# Altium footprint library MEBot.PcbLib: 161 footprints (part 2 of 11)
Each footprint in its own frame and in the unit in brackets; x right, y up, seen from the top. Pads: shape width x height; smd on the part's side, far side on the other; paste and mask are expansions set on the pad; w line width, h text height; cw(c..) or ccw(c..) is an arc to the next point about the centre after c.
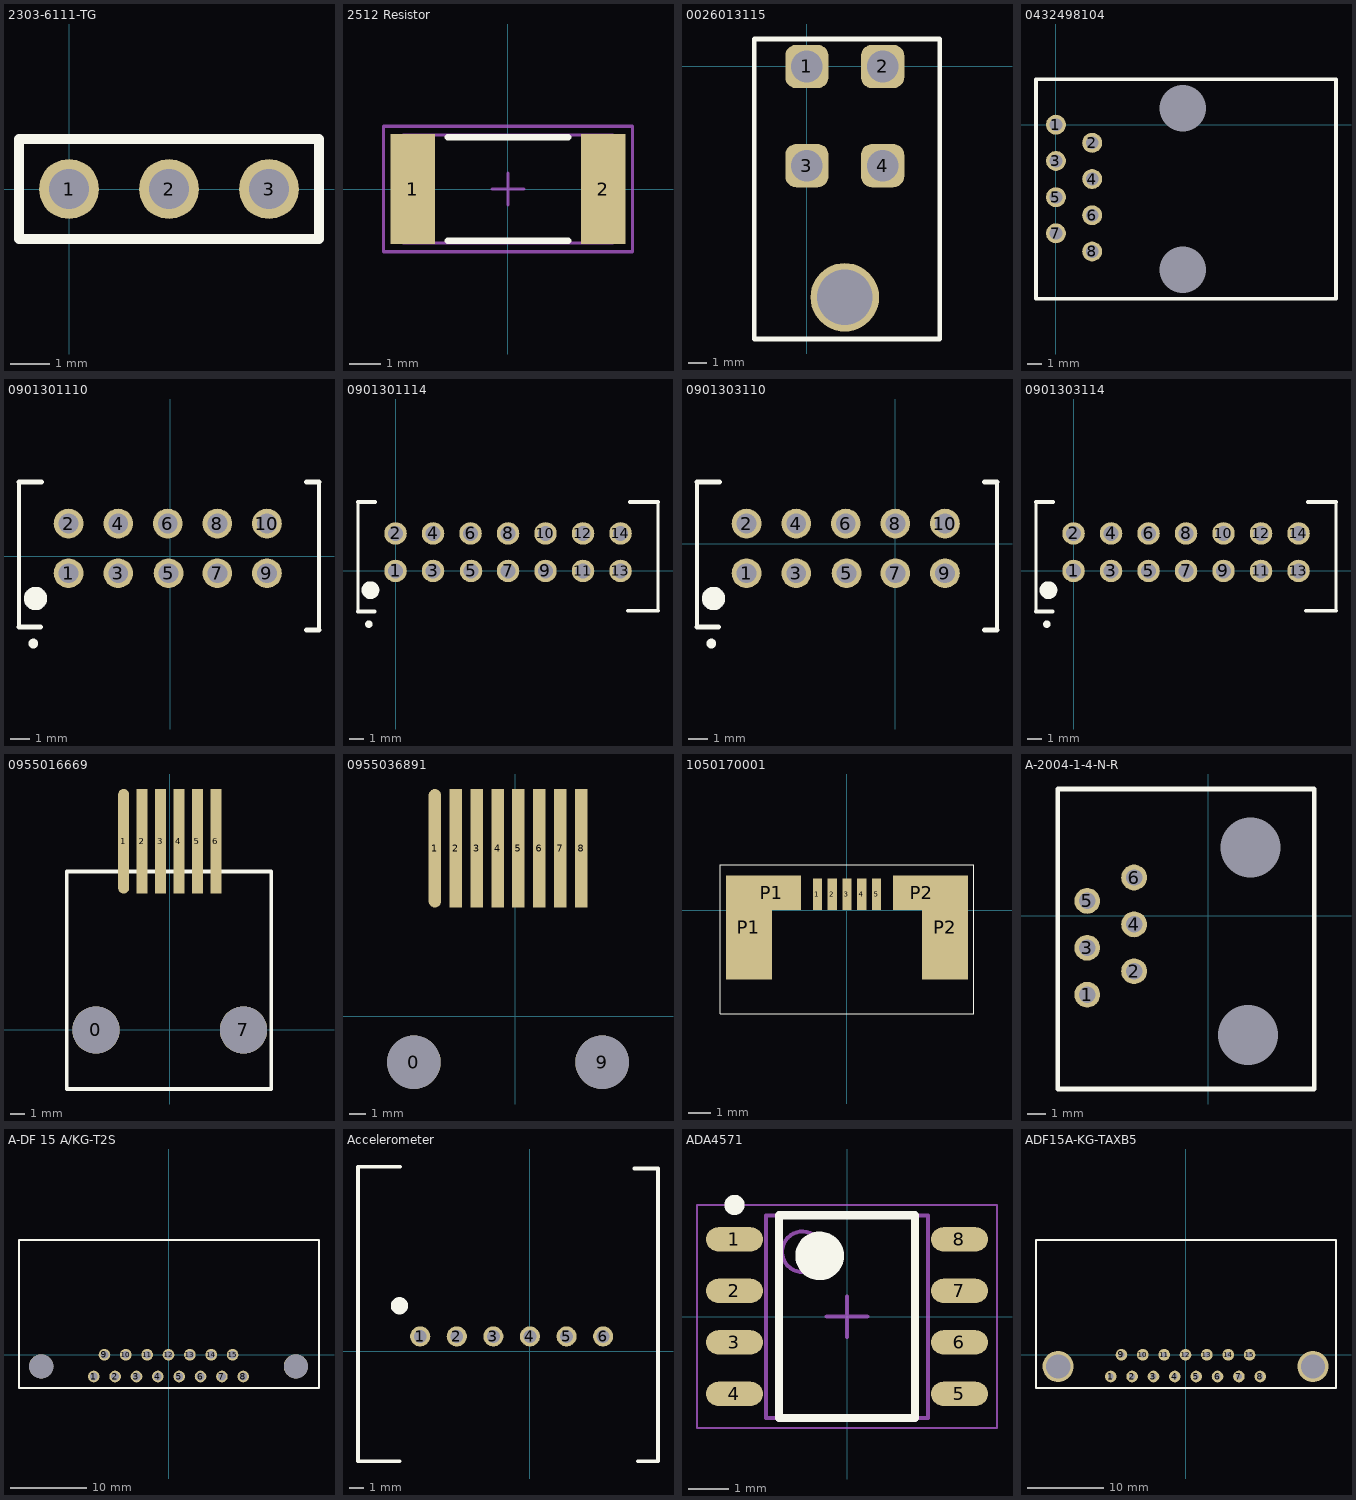
[diagram p1: the footprints below, top view; thin cyan lines are the x and y axes]

## 2303-6111-TG [mil] "CONN HEADER VERT 3POS 2.54MM"
pads (3):
  round 60 hole 40: 1(0,0) 2(100,0) 3(200,0)
Top Overlay:
  lines w10: -50,-50 250,-50 250,50 -50,50 -50,-50
3D body "Pin Header 3 x1 TH 2.54mm Pitch.stp": height 350, standoff -100, extent -50,-50 250,50
3D body "Pin Header 3 x1 TH 2.54mm Pitch.stp": height 350, standoff -100, extent -45,-40 255,60

## 2512 Resistor [mm] "Chip Resistor, 2-Leads, Body 6.4x3.2mm, IPC Medium Density"
height 0.7
pads (2):
  rect 1.4x3.45 smd: 1(-3,0) 2(3,0)
Top Overlay:
  lines w0.2: -1.9,-1.625 1.9,-1.625 ; -1.9,1.625 1.9,1.625
Mechanical 13:
  lines w0.1: -3.3,-1.7 3.3,-1.7 3.3,1.7 -3.3,1.7 -3.3,-1.7
Mechanical 15:
  lines w0.1: -0.5,0 0.5,0 ; 0,-0.5 0,0.5 ; -3.925,-1.975 3.925,-1.975 3.925,1.975 -3.925,1.975 -3.925,-1.975
3D body: height 0.7, standoff 0, extent -3.3,-1.7 3.3,1.7

## 0026013115 [mm] "CONN HEADER R/A 4POS 4.2MM"
pads (5):
  rrect50% 2.4x2.4 hole 1.75: 1(0,0) 2(4.2,0) 3(0,-5.5) 4(4.2,-5.5)
  round 3.8 hole 3.1: ""(2.1,-12.8)
Top Overlay:
  lines w0.254: -2.921,-15.113 -2.921,1.524 7.366,1.524 7.366,-15.113 -2.921,-15.113
3D body "026013115.stp": height 11.4, standoff -3.6, extent -2.667,-19.365 7.333,0.569

## 0432498104 [mil] "CONN MOD JACK 8P8C R/A UNSHLD"
pads (10):
  round 55 hole 35: 1(0,0) 2(100,-50) 3(0,-100) 4(100,-150) 5(0,-200) 6(100,-250) 7(0,-300) 8(100,-350)
  round 120 hole 127.95 unplated: ""(350.39,-400) ""(350.39,45)
Top Overlay:
  lines w10: -55,-480 -55,125 773.26,125 773.26,-480 -55,-480
3D body "432498104.stp": height 502.5, standoff -142.5, extent -46.74,-476.2 763.26,123.8

## 0901301110 [mil]
pads (10):
  round 60 hole 40: 1(-205,-33.86) 2(-205,66.14) 3(-105,-33.86) 4(-105,66.14) 5(-3.43,-33.86) 6(-5,66.14) 7(95,-33.86) 8(95,66.14) 9(195,-33.86) 10(195,66.14)
Top Overlay:
  circle w23.62: c-271.81,-85 r11.81
  circle w9.84: c-276.06,-175.79 r4.92
  lines w7.87: -305,-142.32 -305,150 ; 300,-148.23 300,150
  lines w10: -305,-142.32 -261.3,-142.32 ; -305,150 -259.53,150 ; 275,-148.23 300,-148.23 ; 275,150 300,150
3D body "901301110.stp": height 214.57, standoff -328.74, extent -301.06,-171.92 291.07,211.94

## 0901301114 [mil] "CONN HEADER VERT 14POS 2.54MM"
height 393.7
pads (14):
  round 60 hole 40: 1(0,0) 2(0,100) 3(100,0) 4(100,100) 5(201.57,0) 6(200,100) 7(300,0) 8(300,100) 9(400,0) 10(400,100) 11(500,0) 12(500,100) 13(600,0) 14(600,100)
Top Overlay:
  circle w23.62: c-66.81,-51.14 r11.81
  circle w9.84: c-71.06,-141.93 r4.92
  lines w7.87: -100,-108.46 -100,183.86 ; 700,-106.14 700,183.86
  lines w10: -100,-108.46 -56.3,-108.46 ; -100,183.86 -54.53,183.86 ; 620,-106.14 700,-106.14 ; 625,183.86 700,183.86
3D body "901301114.stp": height 434.57, standoff -108.74, extent -96.06,-140 696.06,243.86

## 0901303110 [mil] "CONN HEADER R/A 10POS 2.54MM"
height 393.7
pads (10):
  round 60 hole 40: 1(-300,-58.86) 2(-300,41.14) 3(-200,-58.86) 4(-200,41.14) 5(-98.43,-58.86) 6(-100,41.14) 7(0,-58.86) 8(0,41.14) 9(100,-58.86) 10(100,41.14)
Top Overlay:
  circle w9.84: c-371.06,-200.79 r4.92
  circle w23.62: c-366.81,-110 r11.81
  lines w7.87: -400,-167.32 -400,125 ; 205,-173.23 205,125
  lines w10: -400,-167.32 -356.3,-167.32 ; -400,125 -354.53,125 ; 180,-173.23 205,-173.23 ; 180,125 205,125
3D body "901303110.stp": height 391.93, standoff -106.1, extent -396.06,-472.68 196.07,55

## 0901303114 [mil] "CONN HEADER R/A 14POS 2.54MM"
height 393.7
pads (14):
  round 60 hole 40: 1(0,0) 2(0,100) 3(100,0) 4(100,100) 5(200,0) 6(200,100) 7(300,0) 8(300,100) 9(400,0) 10(400,100) 11(500,0) 12(500,100) 13(600,0) 14(600,100)
Top Overlay:
  circle w23.62: c-66.81,-51.14 r11.81
  circle w9.84: c-71.06,-141.93 r4.92
  lines w7.87: -100,-108.46 -100,183.86 ; 700,-106.14 700,183.86
  lines w10: -100,-108.46 -56.3,-108.46 ; -100,183.86 -54.53,183.86 ; 620,-106.14 700,-106.14 ; 625,183.86 700,183.86
3D body "901303114.stp": height 391.93, standoff -106.1, extent -96.06,-414.56 696.07,113.12

## 0955016669 [mm] "CONN MOD JACK 6P6C R/A UNSHLD"
height 16
pads (8):
  round 3.25 hole 3.25: 0(-5.08,0) 7(5.08,0)
  rrect100% 0.76x7.2 smd: 1(-3.175,13)
  rect 0.76x7.2 smd: 2(-1.905,13) 3(-0.635,13) 4(0.635,13) 5(1.905,13) 6(3.175,13)
Top Overlay:
  lines w0.254: -7.087,-4.064 -7.087,10.922 6.985,10.922 6.985,-4.064 -7.087,-4.064
3D body "955016669.stp": height 12.1, standoff -2.4, extent -6.68,-7.938 6.53,12.612

## 0955036891 [mm] "CONN MOD JACK 8P8C VERT UNSHLD"
pads (10):
  round 3.25 hole 3.25: 0(-6.144,-2.79) 9(5.286,-2.79)
  rrect100% 0.76x7.2 smd: 1(-4.874,10.21)
  rect 0.76x7.2 smd: 2(-3.604,10.21) 3(-2.334,10.21) 4(-1.064,10.21) 5(0.206,10.21) 6(1.476,10.21) 7(2.746,10.21) 8(4.016,10.21)
3D body "955036891.stp": height 15.72, standoff -2.98, extent -8.049,-7.79 7.191,9.58

## 1050170001 [mil] "CONN RCPT USB2.0 MICRO B SMD R/A"
pads (9):
  rect 15.75x55.12 smd: 1(-51.18,27.72) 2(-25.59,27.72) 3(0,27.72) 4(25.59,27.72) 5(51.18,27.72)
  rect 80x180 smd: P1(-170,-30) P2(170,-30)
  rect 100x60 smd: P1(-130,30) P2(130,30)
Top Overlay:
  lines w1.97: -220,-180 220,-180 220,78.9 -220,78.9 -220,-180
3D body "micro USB.STEP": height 115.78, standoff 0.68, extent -155.42,-185.52 158.5,28.1

## A-2004-1-4-N-R [mil] "CONN MOD JACK 6P6C R/A UNSHLD"
pads (8):
  round 55 hole 35: 1(-258.26,-168.8) 2(-158.26,-118.8) 3(-258.26,-68.8) 4(-158.26,-18.8) 5(-258.26,31.2) 6(-158.26,81.2)
  round 120 hole 127.95 unplated: ""(85,-255) ""(90,145)
Top Overlay:
  lines w10: -321,-370 -321,270 225.99,270 225.99,-370 -321,-370
3D body "6PIN THRUHOLE modular jack.STEP": height 647.15, standoff -144.19, extent -306.02,-359.06 505,259.06

## A-DF 15 A/KG-T2S [mil] "CONN D-SUB RCPT 15POS R/A SLDR"
pads (17):
  round 60 hole 40: 1(-385,-112) 2(-275,-112) 3(-165,-112) 4(-55,-112) 5(55,-112) 6(165,-112) 7(275,-112) 8(385,-112) 9(-330,0) 10(-220,0) 11(-110,0) 12(0,0) 13(110,0) 14(220,0) 15(330,0)
  round 125 hole 125: ""(-656,-60) ""(656,-60)
Top Overlay:
  lines w10: -770,590 -770,-170 775,-170 775,590 -765,590
3D body "SD15S-RA-PC.step": height 517.05, standoff -126.65, extent -770.47,-170 770.47,550.47

## Accelerometer [mil] "ADXKL345"
height 393.7
pads (6):
  round 55 hole 35: 1(-300,41.14) 2(-200,41.14) 3(-100,41.14) 4(0,41.14) 5(100,41.14) 6(200,41.14)
Top Overlay:
  circle w23.62: c-356.81,125 r11.81
  lines w10: -356.3,-300 -470,-300 -470,505 -354.53,505 ; 285,500 350,500 350,-300 295,-300
3D body "ACCX.STEP": height 220.47, standoff -220.47, extent -448.7,-292.4 338.7,495

## ADA4571 [mm] "SOIC, 8-Leads, Body 4.90x3.90mm, Pitch 1.27mm, IPC Medium Density"
height 1.88
pads (8):
  oval 1.4x0.6 smd: 1(-2.775,1.905) 2(-2.775,0.635) 3(-2.775,-0.635) 4(-2.775,-1.905) 5(2.775,-1.905) 6(2.775,-0.635) 7(2.775,0.635) 8(2.775,1.905)
Top Overlay:
  circle w0.25: c-2.775,2.755 r0.125
  circle w0.6: c-0.675,1.5 r0.3
  lines w0.2: -1.675,-2.5 -1.675,2.5 1.675,2.5 1.675,-2.5 -1.675,-2.5
Mechanical 13:
  circle w0.1: c-1.1,1.6 r0.5
  lines w0.1: -2,-2.5 -2,2.5 2,2.5 2,-2.5 -2,-2.5
Mechanical 15:
  lines w0.05: -3.7,-2.75 -3.7,2.75 3.7,2.75 3.7,-2.75 -3.7,-2.75
  lines w0.1: -0.5,0 0.5,0 ; 0,-0.5 0,0.5
3D body: height 1.88, standoff 0.1, extent -2,-2.5 2,2.5

## ADF15A-KG-TAXB5 [mil] "CONN D-SUB RCPT 15POS R/A SLDR"
pads (17):
  round 60 hole 30: 1(-385,-112) 2(-275,-112) 3(-165,-112) 4(-55,-112) 5(55,-112) 6(165,-112) 7(275,-112) 8(385,-112) 9(-330,0) 10(-220,0) 11(-110,0) 12(0,0) 13(110,0) 14(220,0) 15(330,0)
  round 160 hole 125: ""(-656,-60) ""(656,-60)
Top Overlay:
  lines w10: -770,590 -770,-170 775,-170 775,590 -765,590
3D body "SD15S-RA-PC.step": height 517.05, standoff -126.65, extent -775,145 765.94,865.47